# Altium schematic symbol library jlcpcb_2025_04_capacitors_extended_0603.schlib: 3668 symbols (part 12 of 20) (continued)
## CGA3E2X7R2A103KT0Y0N
designator C?  Capacitance: 10nF  (hidden comment: *)
Capacitor, Ceramic (MLCC), 10nF, ±10%, 100V, X7R, ±10%, SMD 0603; Manufacturer: TDK; Manufacturer Part Number: CGA3E2X7R2A103KT0Y0N; Package Size: 0603; JLCPCB Basic Part: No; JLCPCB Part Number: C338047; Supplier 1: LCSC; Category: Capacitors - MLCC; Supplier Part Number 1: C338047; Tolerance: ±10%; Voltage Rating: 100V; Temperature Coefficient: X7R; RoHS: Yes; ComponentLink1Description: Datasheet; ComponentLink1URL: https://wmsc.lcsc.com/wmsc/upload/file/pdf/v2/lcsc/2304140030_TDK-CGA3E2X7R2A103KT0Y0N_C338047.pdf; ComponentLink2Description: JLCPCB Part URL; ComponentLink2URL: https://jlcpcb.com/partdetail/C338047; ComponentLink3Description: LCSC Part URL; ComponentLink3URL: https://lcsc.com/product-detail/Multilayer-Ceramic-Capacitors-MLCC---SMD-SMT_TDK-TDK-CGA3E2X7R2A103KT0Y0N_C338047.html
footprint CAP-0603 (0603 (1608M) Capacitor)
pins: 1, 2

## CGA3E2X7R2A223KT0Y0N
designator C?  Capacitance: 22nF  (hidden comment: *)
Capacitor, Ceramic (MLCC), 22nF, ±10%, 100V, X7R, ±10%, SMD 0603; Manufacturer: TDK; Manufacturer Part Number: CGA3E2X7R2A223KT0Y0N; Package Size: 0603; JLCPCB Basic Part: No; JLCPCB Part Number: C342891; Supplier 1: LCSC; Category: Capacitors - MLCC; Supplier Part Number 1: C342891; Tolerance: ±10%; Voltage Rating: 100V; Temperature Coefficient: X7R; RoHS: Yes; ComponentLink1Description: Datasheet; ComponentLink2Description: JLCPCB Part URL; ComponentLink2URL: https://jlcpcb.com/partdetail/C342891; ComponentLink3Description: LCSC Part URL; ComponentLink3URL: https://lcsc.com/product-detail/Multilayer-Ceramic-Capacitors-MLCC---SMD-SMT_TDK-TDK-CGA3E2X7R2A223KT0Y0N_C342891.html
footprint CAP-0603 (0603 (1608M) Capacitor)
pins: 1, 2

## CGA3E2X7R2A332KT0Y0N
designator C?  Capacitance: 3.3nF  (hidden comment: *)
Capacitor, Ceramic (MLCC), 3.3nF, ±10%, 100V, X7R, ±10%, SMD 0603; Manufacturer: TDK; Manufacturer Part Number: CGA3E2X7R2A332KT0Y0N; Package Size: 0603; JLCPCB Basic Part: No; JLCPCB Part Number: C338064; Supplier 1: LCSC; Category: Capacitors - MLCC; Supplier Part Number 1: C338064; Tolerance: ±10%; Voltage Rating: 100V; Temperature Coefficient: X7R; RoHS: Yes; ComponentLink1Description: Datasheet; ComponentLink1URL: https://wmsc.lcsc.com/wmsc/upload/file/pdf/v2/lcsc/2304140030_TDK-CGA3E2X7R2A332KT0Y0N_C338064.pdf; ComponentLink2Description: JLCPCB Part URL; ComponentLink2URL: https://jlcpcb.com/partdetail/C338064; ComponentLink3Description: LCSC Part URL; ComponentLink3URL: https://lcsc.com/product-detail/Multilayer-Ceramic-Capacitors-MLCC---SMD-SMT_TDK-TDK-CGA3E2X7R2A332KT0Y0N_C338064.html
footprint CAP-0603 (0603 (1608M) Capacitor)
pins: 1, 2

## CGA3E2X7R2A472KT0Y0N
designator C?  Capacitance: 4.7nF  (hidden comment: *)
Capacitor, Ceramic (MLCC), 4.7nF, ±10%, 100V, X7R, ±10%, SMD 0603; Manufacturer: TDK; Manufacturer Part Number: CGA3E2X7R2A472KT0Y0N; Package Size: 0603; JLCPCB Basic Part: No; JLCPCB Part Number: C342899; Supplier 1: LCSC; Category: Capacitors - MLCC; Supplier Part Number 1: C342899; Tolerance: ±10%; Voltage Rating: 100V; Temperature Coefficient: X7R; RoHS: Yes; ComponentLink1Description: Datasheet; ComponentLink1URL: https://wmsc.lcsc.com/wmsc/upload/file/pdf/v2/lcsc/2304140030_TDK-CGA3E2X7R2A472KT0Y0N_C342899.pdf; ComponentLink2Description: JLCPCB Part URL; ComponentLink2URL: https://jlcpcb.com/partdetail/C342899; ComponentLink3Description: LCSC Part URL; ComponentLink3URL: https://lcsc.com/product-detail/Multilayer-Ceramic-Capacitors-MLCC---SMD-SMT_TDK-TDK-CGA3E2X7R2A472KT0Y0N_C342899.html
footprint CAP-0603 (0603 (1608M) Capacitor)
pins: 1, 2

## CGA3E2X8R1H102KT0Y0H
designator C?  Capacitance: 1nF  (hidden comment: *)
Capacitor, Ceramic (MLCC), 1nF, ±10%, 50V, X8R, ±10%, SMD 0603; Manufacturer: TDK; Manufacturer Part Number: CGA3E2X8R1H102KT0Y0H; Package Size: 0603; JLCPCB Basic Part: No; JLCPCB Part Number: C342999; Supplier 1: LCSC; Category: Capacitors - MLCC; Supplier Part Number 1: C342999; Tolerance: ±10%; Voltage Rating: 50V; Temperature Coefficient: X8R; RoHS: Yes; ComponentLink1Description: Datasheet; ComponentLink1URL: https://wmsc.lcsc.com/wmsc/upload/file/pdf/v2/lcsc/2205091745_TDK-CGA3E2X8R1H102KT0Y0H_C342999.pdf; ComponentLink2Description: JLCPCB Part URL; ComponentLink2URL: https://jlcpcb.com/partdetail/C342999; ComponentLink3Description: LCSC Part URL; ComponentLink3URL: https://lcsc.com/product-detail/Multilayer-Ceramic-Capacitors-MLCC---SMD-SMT_TDK-TDK-CGA3E2X8R1H102KT0Y0H_C342999.html
footprint CAP-0603 (0603 (1608M) Capacitor)
pins: 1, 2

## CGA3E2X8R1H103KT0Y0H
designator C?  Capacitance: 10nF  (hidden comment: *)
Capacitor, Ceramic (MLCC), 10nF, ±10%, 50V, X8R, ±10%, SMD 0603; Manufacturer: TDK; Manufacturer Part Number: CGA3E2X8R1H103KT0Y0H; Package Size: 0603; JLCPCB Basic Part: No; JLCPCB Part Number: C445735; Supplier 1: LCSC; Category: Capacitors - MLCC; Supplier Part Number 1: C445735; Tolerance: ±10%; Voltage Rating: 50V; Temperature Coefficient: X8R; RoHS: Yes; ComponentLink1Description: Datasheet; ComponentLink1URL: https://wmsc.lcsc.com/wmsc/upload/file/pdf/v2/lcsc/2304140030_TDK-CGA3E2X8R1H103KT0Y0H_C445735.pdf; ComponentLink2Description: JLCPCB Part URL; ComponentLink2URL: https://jlcpcb.com/partdetail/C445735; ComponentLink3Description: LCSC Part URL; ComponentLink3URL: https://lcsc.com/product-detail/Multilayer-Ceramic-Capacitors-MLCC---SMD-SMT_TDK-TDK-CGA3E2X8R1H103KT0Y0H_C445735.html
footprint CAP-0603 (0603 (1608M) Capacitor)
pins: 1, 2

## CGA3E2X8R1H222KT0Y0H
designator C?  Capacitance: 2.2nF  (hidden comment: *)
Capacitor, Ceramic (MLCC), 2.2nF, ±10%, 50V, X8R, ±10%, SMD 0603; Manufacturer: TDK; Manufacturer Part Number: CGA3E2X8R1H222KT0Y0H; Package Size: 0603; JLCPCB Basic Part: No; JLCPCB Part Number: C343000; Supplier 1: LCSC; Category: Capacitors - MLCC; Supplier Part Number 1: C343000; Tolerance: ±10%; Voltage Rating: 50V; Temperature Coefficient: X8R; RoHS: Yes; ComponentLink1Description: Datasheet; ComponentLink1URL: https://wmsc.lcsc.com/wmsc/upload/file/pdf/v2/lcsc/1912111437_TDK-CGA3E2X8R1H222KT0Y0H_C343000.pdf; ComponentLink2Description: JLCPCB Part URL; ComponentLink2URL: https://jlcpcb.com/partdetail/C343000; ComponentLink3Description: LCSC Part URL; ComponentLink3URL: https://lcsc.com/product-detail/Multilayer-Ceramic-Capacitors-MLCC---SMD-SMT_TDK-TDK-CGA3E2X8R1H222KT0Y0H_C343000.html
footprint CAP-0603 (0603 (1608M) Capacitor)
pins: 1, 2

## CGA3E2X8R1H332KT0Y0H
designator C?  Capacitance: 3.3nF  (hidden comment: *)
Capacitor, Ceramic (MLCC), 3.3nF, ±10%, 50V, X8R, ±10%, SMD 0603; Manufacturer: TDK; Manufacturer Part Number: CGA3E2X8R1H332KT0Y0H; Package Size: 0603; JLCPCB Basic Part: No; JLCPCB Part Number: C432942; Supplier 1: LCSC; Category: Capacitors - MLCC; Supplier Part Number 1: C432942; Tolerance: ±10%; Voltage Rating: 50V; Temperature Coefficient: X8R; RoHS: Yes; ComponentLink1Description: Datasheet; ComponentLink1URL: https://wmsc.lcsc.com/wmsc/upload/file/pdf/v2/lcsc/2304140030_TDK-CGA3E2X8R1H332KT0Y0H_C432942.pdf; ComponentLink2Description: JLCPCB Part URL; ComponentLink2URL: https://jlcpcb.com/partdetail/C432942; ComponentLink3Description: LCSC Part URL; ComponentLink3URL: https://lcsc.com/product-detail/Multilayer-Ceramic-Capacitors-MLCC---SMD-SMT_TDK-TDK-CGA3E2X8R1H332KT0Y0H_C432942.html
footprint CAP-0603 (0603 (1608M) Capacitor)
pins: 1, 2

## CGA3E2X8R1H473KT0Y0H
designator C?  Capacitance: 47nF  (hidden comment: *)
Capacitor, Ceramic (MLCC), 47nF, ±10%, 50V, X8R, ±10%, SMD 0603; Manufacturer: TDK; Manufacturer Part Number: CGA3E2X8R1H473KT0Y0H; Package Size: 0603; JLCPCB Basic Part: No; JLCPCB Part Number: C342975; Supplier 1: LCSC; Category: Capacitors - MLCC; Supplier Part Number 1: C342975; Tolerance: ±10%; Voltage Rating: 50V; Temperature Coefficient: X8R; RoHS: Yes; ComponentLink1Description: Datasheet; ComponentLink1URL: https://wmsc.lcsc.com/wmsc/upload/file/pdf/v2/lcsc/2304140030_TDK-CGA3E2X8R1H473KT0Y0H_C342975.pdf; ComponentLink2Description: JLCPCB Part URL; ComponentLink2URL: https://jlcpcb.com/partdetail/C342975; ComponentLink3Description: LCSC Part URL; ComponentLink3URL: https://lcsc.com/product-detail/Multilayer-Ceramic-Capacitors-MLCC---SMD-SMT_TDK-TDK-CGA3E2X8R1H473KT0Y0H_C342975.html
footprint CAP-0603 (0603 (1608M) Capacitor)
pins: 1, 2

## CGA3E2X8R2A103KT0Y0H
designator C?  Capacitance: 10nF  (hidden comment: *)
Capacitor, Ceramic (MLCC), 10nF, ±10%, 100V, X8R, ±10%, SMD 0603; Manufacturer: TDK; Manufacturer Part Number: CGA3E2X8R2A103KT0Y0H; Package Size: 0603; JLCPCB Basic Part: No; JLCPCB Part Number: C445734; Supplier 1: LCSC; Category: Capacitors - MLCC; Supplier Part Number 1: C445734; Tolerance: ±10%; Voltage Rating: 100V; Temperature Coefficient: X8R; RoHS: Yes; ComponentLink1Description: Datasheet; ComponentLink1URL: https://wmsc.lcsc.com/wmsc/upload/file/pdf/v2/lcsc/2304140030_TDK-CGA3E2X8R2A103KT0Y0H_C445734.pdf; ComponentLink2Description: JLCPCB Part URL; ComponentLink2URL: https://jlcpcb.com/partdetail/C445734; ComponentLink3Description: LCSC Part URL; ComponentLink3URL: https://lcsc.com/product-detail/Multilayer-Ceramic-Capacitors-MLCC---SMD-SMT_TDK-TDK-CGA3E2X8R2A103KT0Y0H_C445734.html
footprint CAP-0603 (0603 (1608M) Capacitor)
pins: 1, 2

## CGA3E2X8R2A222KT0Y0H
designator C?  Capacitance: 2.2nF  (hidden comment: *)
Capacitor, Ceramic (MLCC), 2.2nF, ±10%, 100V, X8R, ±10%, SMD 0603; Manufacturer: TDK; Manufacturer Part Number: CGA3E2X8R2A222KT0Y0H; Package Size: 0603; JLCPCB Basic Part: No; JLCPCB Part Number: C694502; Supplier 1: LCSC; Category: Capacitors - MLCC; Supplier Part Number 1: C694502; Tolerance: ±10%; Voltage Rating: 100V; Temperature Coefficient: X8R; RoHS: Yes; ComponentLink1Description: Datasheet; ComponentLink1URL: https://wmsc.lcsc.com/wmsc/upload/file/pdf/v2/lcsc/2304140030_TDK-CGA3E2X8R2A222KT0Y0H_C694502.pdf; ComponentLink2Description: JLCPCB Part URL; ComponentLink2URL: https://jlcpcb.com/partdetail/C694502; ComponentLink3Description: LCSC Part URL; ComponentLink3URL: https://lcsc.com/product-detail/Multilayer-Ceramic-Capacitors-MLCC---SMD-SMT_TDK-TDK-CGA3E2X8R2A222KT0Y0H_C694502.html
footprint CAP-0603 (0603 (1608M) Capacitor)
pins: 1, 2

## CGA3E2X8R2A472KT0Y0H
designator C?  Capacitance: 4.7nF  (hidden comment: *)
Capacitor, Ceramic (MLCC), 4.7nF, ±10%, 100V, X8R, ±10%, SMD 0603; Manufacturer: TDK; Manufacturer Part Number: CGA3E2X8R2A472KT0Y0H; Package Size: 0603; JLCPCB Basic Part: No; JLCPCB Part Number: C880688; Supplier 1: LCSC; Category: Capacitors - MLCC; Supplier Part Number 1: C880688; Tolerance: ±10%; Voltage Rating: 100V; Temperature Coefficient: X8R; RoHS: Yes; ComponentLink1Description: Datasheet; ComponentLink1URL: https://wmsc.lcsc.com/wmsc/upload/file/pdf/v2/lcsc/2304140030_TDK-CGA3E2X8R2A472KT0Y0H_C880688.pdf; ComponentLink2Description: JLCPCB Part URL; ComponentLink2URL: https://jlcpcb.com/partdetail/C880688; ComponentLink3Description: LCSC Part URL; ComponentLink3URL: https://lcsc.com/product-detail/Multilayer-Ceramic-Capacitors-MLCC---SMD-SMT_TDK-TDK-CGA3E2X8R2A472KT0Y0H_C880688.html
footprint CAP-0603 (0603 (1608M) Capacitor)
pins: 1, 2

## CGA3E3C0G2E101JT0Y0N
designator C?  Capacitance: 100pF  (hidden comment: *)
Capacitor, Ceramic (MLCC), 100pF, ±5%, 250V, C0G, ±5%, SMD 0603; Manufacturer: TDK; Manufacturer Part Number: CGA3E3C0G2E101JT0Y0N; Package Size: 0603; JLCPCB Basic Part: No; JLCPCB Part Number: C342924; Supplier 1: LCSC; Category: Capacitors - MLCC; Supplier Part Number 1: C342924; Tolerance: ±5%; Voltage Rating: 250V; Temperature Coefficient: C0G; RoHS: Yes; ComponentLink1Description: Datasheet; ComponentLink1URL: https://wmsc.lcsc.com/wmsc/upload/file/pdf/v2/lcsc/2304140030_TDK-CGA3E3C0G2E101JT0Y0N_C342924.pdf; ComponentLink2Description: JLCPCB Part URL; ComponentLink2URL: https://jlcpcb.com/partdetail/C342924; ComponentLink3Description: LCSC Part URL; ComponentLink3URL: https://lcsc.com/product-detail/Multilayer-Ceramic-Capacitors-MLCC---SMD-SMT_TDK-TDK-CGA3E3C0G2E101JT0Y0N_C342924.html
footprint CAP-0603 (0603 (1608M) Capacitor)
pins: 1, 2

## CGA3E3C0G2E221JT0Y0N
designator C?  Capacitance: 220pF  (hidden comment: *)
Capacitor, Ceramic (MLCC), 220pF, ±5%, 250V, C0G, ±5%, SMD 0603; Manufacturer: TDK; Manufacturer Part Number: CGA3E3C0G2E221JT0Y0N; Package Size: 0603; JLCPCB Basic Part: No; JLCPCB Part Number: C695386; Supplier 1: LCSC; Category: Capacitors - MLCC; Supplier Part Number 1: C695386; Tolerance: ±5%; Voltage Rating: 250V; Temperature Coefficient: C0G; RoHS: Yes; ComponentLink1Description: Datasheet; ComponentLink1URL: https://wmsc.lcsc.com/wmsc/upload/file/pdf/v2/lcsc/2009151538_TDK-CGA3E3C0G2E221JT0Y0N_C695386.pdf; ComponentLink2Description: JLCPCB Part URL; ComponentLink2URL: https://jlcpcb.com/partdetail/C695386; ComponentLink3Description: LCSC Part URL; ComponentLink3URL: https://lcsc.com/product-detail/Multilayer-Ceramic-Capacitors-MLCC---SMD-SMT_TDK-TDK-CGA3E3C0G2E221JT0Y0N_C695386.html
footprint CAP-0603 (0603 (1608M) Capacitor)
pins: 1, 2

## CGA3E3X5R1H105KT0Y0N
designator C?  Capacitance: 1uF  (hidden comment: *)
Capacitor, Ceramic (MLCC), 1uF, ±10%, 50V, X5R, ±10%, SMD 0603; Manufacturer: TDK; Manufacturer Part Number: CGA3E3X5R1H105KT0Y0N; Package Size: 0603; JLCPCB Basic Part: No; JLCPCB Part Number: C342951; Supplier 1: LCSC; Category: Capacitors - MLCC; Supplier Part Number 1: C342951; Tolerance: ±10%; Voltage Rating: 50V; Temperature Coefficient: X5R; RoHS: Yes; ComponentLink1Description: Datasheet; ComponentLink1URL: https://wmsc.lcsc.com/wmsc/upload/file/pdf/v2/lcsc/2304140030_TDK-CGA3E3X5R1H105KT0Y0N_C342951.pdf; ComponentLink2Description: JLCPCB Part URL; ComponentLink2URL: https://jlcpcb.com/partdetail/C342951; ComponentLink3Description: LCSC Part URL; ComponentLink3URL: https://lcsc.com/product-detail/Multilayer-Ceramic-Capacitors-MLCC---SMD-SMT_TDK-TDK-CGA3E3X5R1H105KT0Y0N_C342951.html
footprint CAP-0603 (0603 (1608M) Capacitor)
pins: 1, 2

## CGA3E3X5R1H474KT0Y0N
designator C?  Capacitance: 470nF  (hidden comment: *)
Capacitor, Ceramic (MLCC), 470nF, ±10%, 50V, X5R, ±10%, SMD 0603; Manufacturer: TDK; Manufacturer Part Number: CGA3E3X5R1H474KT0Y0N; Package Size: 0603; JLCPCB Basic Part: No; JLCPCB Part Number: C694503; Supplier 1: LCSC; Category: Capacitors - MLCC; Supplier Part Number 1: C694503; Tolerance: ±10%; Voltage Rating: 50V; Temperature Coefficient: X5R; RoHS: Yes; ComponentLink1Description: Datasheet; ComponentLink1URL: https://wmsc.lcsc.com/wmsc/upload/file/pdf/v2/lcsc/2304140030_TDK-CGA3E3X5R1H474KT0Y0N_C694503.pdf; ComponentLink2Description: JLCPCB Part URL; ComponentLink2URL: https://jlcpcb.com/partdetail/C694503; ComponentLink3Description: LCSC Part URL; ComponentLink3URL: https://lcsc.com/product-detail/Multilayer-Ceramic-Capacitors-MLCC---SMD-SMT_TDK-TDK-CGA3E3X5R1H474KT0Y0N_C694503.html
footprint CAP-0603 (0603 (1608M) Capacitor)
pins: 1, 2

## CGA3E3X5R1H684K080AB
designator C?  Capacitance: 680nF  (hidden comment: *)
Capacitor, Ceramic (MLCC), 680nF, ±10%, 50V, X5R, ±10%, SMD 0603; Manufacturer: TDK; Manufacturer Part Number: CGA3E3X5R1H684K080AB; Package Size: 0603; JLCPCB Basic Part: No; JLCPCB Part Number: C3841920; Supplier 1: LCSC; Category: Capacitors - MLCC; Supplier Part Number 1: C3841920; Tolerance: ±10%; Voltage Rating: 50V; Temperature Coefficient: X5R; RoHS: Yes; ComponentLink1Description: Datasheet; ComponentLink1URL: https://wmsc.lcsc.com/wmsc/upload/file/pdf/v2/lcsc/2401221252_TDK-CGA3E3X5R1H684K080AB_C3841920.pdf; ComponentLink2Description: JLCPCB Part URL; ComponentLink2URL: https://jlcpcb.com/partdetail/C3841920; ComponentLink3Description: LCSC Part URL; ComponentLink3URL: https://lcsc.com/product-detail/Multilayer-Ceramic-Capacitors-MLCC---SMD-SMT_TDK-TDK-CGA3E3X5R1H684K080AB_C3841920.html
footprint CAP-0603 (0603 (1608M) Capacitor)
pins: 1, 2

## CGA3E3X5R1H684KT0Y0N
designator C?  Capacitance: 680nF  (hidden comment: *)
Capacitor, Ceramic (MLCC), 680nF, ±10%, 50V, X5R, ±10%, SMD 0603; Manufacturer: TDK; Manufacturer Part Number: CGA3E3X5R1H684KT0Y0N; Package Size: 0603; JLCPCB Basic Part: No; JLCPCB Part Number: C694504; Supplier 1: LCSC; Category: Capacitors - MLCC; Supplier Part Number 1: C694504; Tolerance: ±10%; Voltage Rating: 50V; Temperature Coefficient: X5R; RoHS: Yes; ComponentLink1Description: Datasheet; ComponentLink1URL: https://wmsc.lcsc.com/wmsc/upload/file/pdf/v2/lcsc/2304140030_TDK-CGA3E3X5R1H684KT0Y0N_C694504.pdf; ComponentLink2Description: JLCPCB Part URL; ComponentLink2URL: https://jlcpcb.com/partdetail/C694504; ComponentLink3Description: LCSC Part URL; ComponentLink3URL: https://lcsc.com/product-detail/Multilayer-Ceramic-Capacitors-MLCC---SMD-SMT_TDK-TDK-CGA3E3X5R1H684KT0Y0N_C694504.html
footprint CAP-0603 (0603 (1608M) Capacitor)
pins: 1, 2

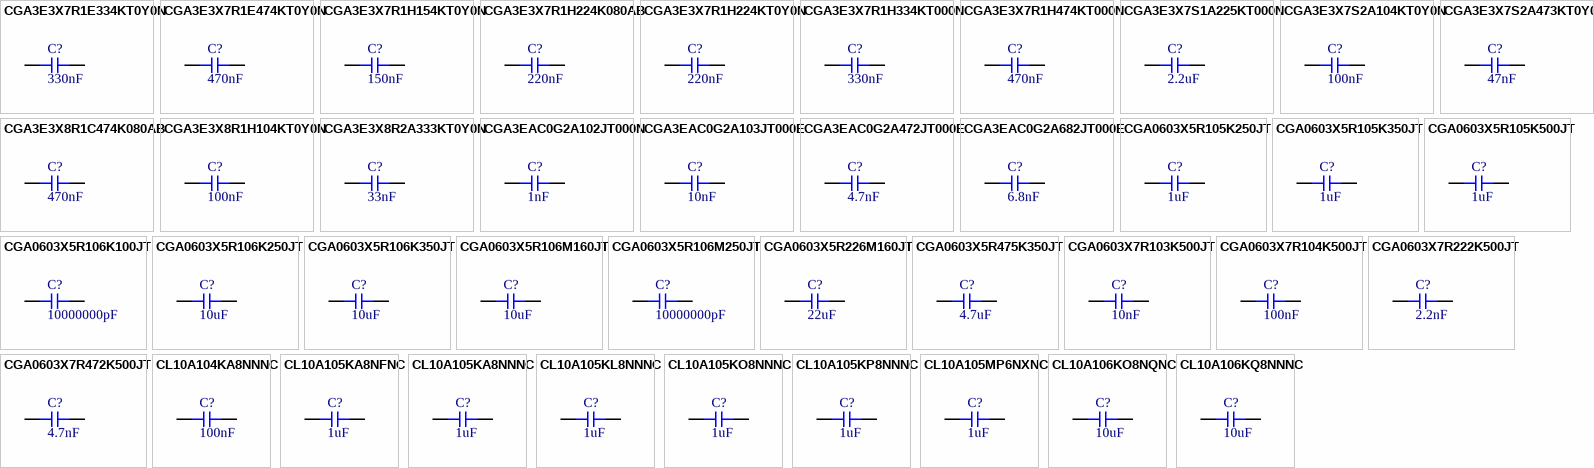
[diagram p54: symbols CGA3E3X7R1E334KT0Y0N to CL10A106KQ8NNNC]

## CGA3E3X7R1E334KT0Y0N
designator C?  Capacitance: 330nF  (hidden comment: *)
Capacitor, Ceramic (MLCC), 330nF, ±10%, 25V, X7R, ±10%, SMD 0603; Manufacturer: TDK; Manufacturer Part Number: CGA3E3X7R1E334KT0Y0N; Package Size: 0603; JLCPCB Basic Part: No; JLCPCB Part Number: C445737; Supplier 1: LCSC; Category: Capacitors - MLCC; Supplier Part Number 1: C445737; Tolerance: ±10%; Voltage Rating: 25V; Temperature Coefficient: X7R; RoHS: Yes; ComponentLink1Description: Datasheet; ComponentLink1URL: https://wmsc.lcsc.com/wmsc/upload/file/pdf/v2/lcsc/2304140030_TDK-CGA3E3X7R1E334KT0Y0N_C445737.pdf; ComponentLink2Description: JLCPCB Part URL; ComponentLink2URL: https://jlcpcb.com/partdetail/C445737; ComponentLink3Description: LCSC Part URL; ComponentLink3URL: https://lcsc.com/product-detail/Multilayer-Ceramic-Capacitors-MLCC---SMD-SMT_TDK-TDK-CGA3E3X7R1E334KT0Y0N_C445737.html
footprint CAP-0603 (0603 (1608M) Capacitor)
pins: 1, 2

## CGA3E3X7R1E474KT0Y0N
designator C?  Capacitance: 470nF  (hidden comment: *)
Capacitor, Ceramic (MLCC), 470nF, ±10%, 25V, X7R, ±10%, SMD 0603; Manufacturer: TDK; Manufacturer Part Number: CGA3E3X7R1E474KT0Y0N; Package Size: 0603; JLCPCB Basic Part: No; JLCPCB Part Number: C342987; Supplier 1: LCSC; Category: Capacitors - MLCC; Supplier Part Number 1: C342987; Tolerance: ±10%; Voltage Rating: 25V; Temperature Coefficient: X7R; RoHS: Yes; ComponentLink1Description: Datasheet; ComponentLink1URL: https://wmsc.lcsc.com/wmsc/upload/file/pdf/v2/lcsc/1912111437_TDK-CGA3E3X7R1E474KT0Y0N_C342987.pdf; ComponentLink2Description: JLCPCB Part URL; ComponentLink2URL: https://jlcpcb.com/partdetail/C342987; ComponentLink3Description: LCSC Part URL; ComponentLink3URL: https://lcsc.com/product-detail/Multilayer-Ceramic-Capacitors-MLCC---SMD-SMT_TDK-TDK-CGA3E3X7R1E474KT0Y0N_C342987.html
footprint CAP-0603 (0603 (1608M) Capacitor)
pins: 1, 2

## CGA3E3X7R1H154KT0Y0N
designator C?  Capacitance: 150nF  (hidden comment: *)
Capacitor, Ceramic (MLCC), 150nF, ±10%, 50V, X7R, ±10%, SMD 0603; Manufacturer: TDK; Manufacturer Part Number: CGA3E3X7R1H154KT0Y0N; Package Size: 0603; JLCPCB Basic Part: No; JLCPCB Part Number: C432943; Supplier 1: LCSC; Category: Capacitors - MLCC; Supplier Part Number 1: C432943; Tolerance: ±10%; Voltage Rating: 50V; Temperature Coefficient: X7R; RoHS: Yes; ComponentLink1Description: Datasheet; ComponentLink1URL: https://wmsc.lcsc.com/wmsc/upload/file/pdf/v2/lcsc/2304140030_TDK-CGA3E3X7R1H154KT0Y0N_C432943.pdf; ComponentLink2Description: JLCPCB Part URL; ComponentLink2URL: https://jlcpcb.com/partdetail/C432943; ComponentLink3Description: LCSC Part URL; ComponentLink3URL: https://lcsc.com/product-detail/Multilayer-Ceramic-Capacitors-MLCC---SMD-SMT_TDK-TDK-CGA3E3X7R1H154KT0Y0N_C432943.html
footprint CAP-0603 (0603 (1608M) Capacitor)
pins: 1, 2

## CGA3E3X7R1H224K080AB
designator C?  Capacitance: 220nF  (hidden comment: *)
Capacitor, Ceramic (MLCC), 220nF, ±10%, 50V, X7R, ±10%, SMD 0603; Manufacturer: TDK; Manufacturer Part Number: CGA3E3X7R1H224K080AB; Package Size: 0603; JLCPCB Basic Part: No; JLCPCB Part Number: C2167174; Supplier 1: LCSC; Category: Capacitors - MLCC; Supplier Part Number 1: C2167174; Tolerance: ±10%; Voltage Rating: 50V; Temperature Coefficient: X7R; RoHS: Yes; ComponentLink1Description: Datasheet; ComponentLink1URL: https://wmsc.lcsc.com/wmsc/upload/file/pdf/v2/lcsc/2304140030_TDK-CGA3E3X7R1H224K080AB_C2167174.pdf; ComponentLink2Description: JLCPCB Part URL; ComponentLink2URL: https://jlcpcb.com/partdetail/C2167174; ComponentLink3Description: LCSC Part URL; ComponentLink3URL: https://lcsc.com/product-detail/Multilayer-Ceramic-Capacitors-MLCC---SMD-SMT_TDK-TDK-CGA3E3X7R1H224K080AB_C2167174.html
footprint CAP-0603 (0603 (1608M) Capacitor)
pins: 1, 2

## CGA3E3X7R1H224KT0Y0N
designator C?  Capacitance: 220nF  (hidden comment: *)
Capacitor, Ceramic (MLCC), 220nF, ±10%, 50V, X7R, ±10%, SMD 0603; Manufacturer: TDK; Manufacturer Part Number: CGA3E3X7R1H224KT0Y0N; Package Size: 0603; JLCPCB Basic Part: No; JLCPCB Part Number: C342967; Supplier 1: LCSC; Category: Capacitors - MLCC; Supplier Part Number 1: C342967; Tolerance: ±10%; Voltage Rating: 50V; Temperature Coefficient: X7R; RoHS: Yes; ComponentLink1Description: Datasheet; ComponentLink1URL: https://wmsc.lcsc.com/wmsc/upload/file/pdf/v2/lcsc/2304140030_TDK-CGA3E3X7R1H224KT0Y0N_C342967.pdf; ComponentLink2Description: JLCPCB Part URL; ComponentLink2URL: https://jlcpcb.com/partdetail/C342967; ComponentLink3Description: LCSC Part URL; ComponentLink3URL: https://lcsc.com/product-detail/Multilayer-Ceramic-Capacitors-MLCC---SMD-SMT_TDK-TDK-CGA3E3X7R1H224KT0Y0N_C342967.html
footprint CAP-0603 (0603 (1608M) Capacitor)
pins: 1, 2

## CGA3E3X7R1H334KT000N
designator C?  Capacitance: 330nF  (hidden comment: *)
Capacitor, Ceramic (MLCC), 330nF, ±10%, 50V, X7R, ±10%, SMD 0603; Manufacturer: TDK; Manufacturer Part Number: CGA3E3X7R1H334KT000N; Package Size: 0603; JLCPCB Basic Part: No; JLCPCB Part Number: C342856; Supplier 1: LCSC; Category: Capacitors - MLCC; Supplier Part Number 1: C342856; Tolerance: ±10%; Voltage Rating: 50V; Temperature Coefficient: X7R; RoHS: Yes; ComponentLink1Description: Datasheet; ComponentLink1URL: https://wmsc.lcsc.com/wmsc/upload/file/pdf/v2/lcsc/2304140030_TDK-CGA3E3X7R1H334KT000N_C342856.pdf; ComponentLink2Description: JLCPCB Part URL; ComponentLink2URL: https://jlcpcb.com/partdetail/C342856; ComponentLink3Description: LCSC Part URL; ComponentLink3URL: https://lcsc.com/product-detail/Multilayer-Ceramic-Capacitors-MLCC---SMD-SMT_TDK-TDK-CGA3E3X7R1H334KT000N_C342856.html
footprint CAP-0603 (0603 (1608M) Capacitor)
pins: 1, 2

## CGA3E3X7R1H474KT000N
designator C?  Capacitance: 470nF  (hidden comment: *)
Capacitor, Ceramic (MLCC), 470nF, ±10%, 50V, X7R, ±10%, SMD 0603; Manufacturer: TDK; Manufacturer Part Number: CGA3E3X7R1H474KT000N; Package Size: 0603; JLCPCB Basic Part: No; JLCPCB Part Number: C342857; Supplier 1: LCSC; Category: Capacitors - MLCC; Supplier Part Number 1: C342857; Tolerance: ±10%; Voltage Rating: 50V; Temperature Coefficient: X7R; RoHS: Yes; ComponentLink1Description: Datasheet; ComponentLink1URL: https://wmsc.lcsc.com/wmsc/upload/file/pdf/v2/lcsc/2304140030_TDK-CGA3E3X7R1H474KT000N_C342857.pdf; ComponentLink2Description: JLCPCB Part URL; ComponentLink2URL: https://jlcpcb.com/partdetail/C342857; ComponentLink3Description: LCSC Part URL; ComponentLink3URL: https://lcsc.com/product-detail/Multilayer-Ceramic-Capacitors-MLCC---SMD-SMT_TDK-TDK-CGA3E3X7R1H474KT000N_C342857.html
footprint CAP-0603 (0603 (1608M) Capacitor)
pins: 1, 2

## CGA3E3X7S1A225KT000N
designator C?  Capacitance: 2.2uF  (hidden comment: *)
Capacitor, Ceramic (MLCC), 2.2uF, ±10%, 10V, X7S, ±10%, SMD 0603; Manufacturer: TDK; Manufacturer Part Number: CGA3E3X7S1A225KT000N; Package Size: 0603; JLCPCB Basic Part: No; JLCPCB Part Number: C338105; Supplier 1: LCSC; Category: Capacitors - MLCC; Supplier Part Number 1: C338105; Tolerance: ±10%; Voltage Rating: 10V; Temperature Coefficient: X7S; RoHS: Yes; ComponentLink1Description: Datasheet; ComponentLink1URL: https://wmsc.lcsc.com/wmsc/upload/file/pdf/v2/lcsc/2304140030_TDK-CGA3E3X7S1A225KT000N_C338105.pdf; ComponentLink2Description: JLCPCB Part URL; ComponentLink2URL: https://jlcpcb.com/partdetail/C338105; ComponentLink3Description: LCSC Part URL; ComponentLink3URL: https://lcsc.com/product-detail/Multilayer-Ceramic-Capacitors-MLCC---SMD-SMT_TDK-TDK-CGA3E3X7S1A225KT000N_C338105.html
footprint CAP-0603 (0603 (1608M) Capacitor)
pins: 1, 2

## CGA3E3X7S2A104KT0Y0N
designator C?  Capacitance: 100nF  (hidden comment: *)
Capacitor, Ceramic (MLCC), 100nF, ±10%, 100V, X7S, ±10%, SMD 0603; Manufacturer: TDK; Manufacturer Part Number: CGA3E3X7S2A104KT0Y0N; Package Size: 0603; JLCPCB Basic Part: No; JLCPCB Part Number: C338075; Supplier 1: LCSC; Category: Capacitors - MLCC; Supplier Part Number 1: C338075; Tolerance: ±10%; Voltage Rating: 100V; Temperature Coefficient: X7S; RoHS: Yes; ComponentLink1Description: Datasheet; ComponentLink1URL: https://wmsc.lcsc.com/wmsc/upload/file/pdf/v2/lcsc/2304140030_TDK-CGA3E3X7S2A104KT0Y0N_C338075.pdf; ComponentLink2Description: JLCPCB Part URL; ComponentLink2URL: https://jlcpcb.com/partdetail/C338075; ComponentLink3Description: LCSC Part URL; ComponentLink3URL: https://lcsc.com/product-detail/Multilayer-Ceramic-Capacitors-MLCC---SMD-SMT_TDK-TDK-CGA3E3X7S2A104KT0Y0N_C338075.html
footprint CAP-0603 (0603 (1608M) Capacitor)
pins: 1, 2

## CGA3E3X7S2A473KT0Y0N
designator C?  Capacitance: 47nF  (hidden comment: *)
Capacitor, Ceramic (MLCC), 47nF, ±10%, 100V, X7S, ±10%, SMD 0603; Manufacturer: TDK; Manufacturer Part Number: CGA3E3X7S2A473KT0Y0N; Package Size: 0603; JLCPCB Basic Part: No; JLCPCB Part Number: C338098; Supplier 1: LCSC; Category: Capacitors - MLCC; Supplier Part Number 1: C338098; Tolerance: ±10%; Voltage Rating: 100V; Temperature Coefficient: X7S; RoHS: Yes; ComponentLink1Description: Datasheet; ComponentLink1URL: https://wmsc.lcsc.com/wmsc/upload/file/pdf/v2/lcsc/2304140030_TDK-CGA3E3X7S2A473KT0Y0N_C338098.pdf; ComponentLink2Description: JLCPCB Part URL; ComponentLink2URL: https://jlcpcb.com/partdetail/C338098; ComponentLink3Description: LCSC Part URL; ComponentLink3URL: https://lcsc.com/product-detail/Multilayer-Ceramic-Capacitors-MLCC---SMD-SMT_TDK-TDK-CGA3E3X7S2A473KT0Y0N_C338098.html
footprint CAP-0603 (0603 (1608M) Capacitor)
pins: 1, 2

## CGA3E3X8R1C474K080AB
designator C?  Capacitance: 470nF  (hidden comment: *)
Capacitor, Ceramic (MLCC), 470nF, ±10%, 16V, X8R, ±10%, SMD 0603; Manufacturer: TDK; Manufacturer Part Number: CGA3E3X8R1C474K080AB; Package Size: 0603; JLCPCB Basic Part: No; JLCPCB Part Number: C2170045; Supplier 1: LCSC; Category: Capacitors - MLCC; Supplier Part Number 1: C2170045; Tolerance: ±10%; Voltage Rating: 16V; Temperature Coefficient: X8R; RoHS: Yes; ComponentLink1Description: Datasheet; ComponentLink1URL: https://wmsc.lcsc.com/wmsc/upload/file/pdf/v2/lcsc/2304140030_TDK-CGA3E3X8R1C474K080AB_C2170045.pdf; ComponentLink2Description: JLCPCB Part URL; ComponentLink2URL: https://jlcpcb.com/partdetail/C2170045; ComponentLink3Description: LCSC Part URL; ComponentLink3URL: https://lcsc.com/product-detail/Multilayer-Ceramic-Capacitors-MLCC---SMD-SMT_TDK-TDK-CGA3E3X8R1C474K080AB_C2170045.html
footprint CAP-0603 (0603 (1608M) Capacitor)
pins: 1, 2

## CGA3E3X8R1H104KT0Y0N
designator C?  Capacitance: 100nF  (hidden comment: *)
Capacitor, Ceramic (MLCC), 100nF, ±10%, 50V, X8R, ±10%, SMD 0603; Manufacturer: TDK; Manufacturer Part Number: CGA3E3X8R1H104KT0Y0N; Package Size: 0603; JLCPCB Basic Part: No; JLCPCB Part Number: C342825; Supplier 1: LCSC; Category: Capacitors - MLCC; Supplier Part Number 1: C342825; Tolerance: ±10%; Voltage Rating: 50V; Temperature Coefficient: X8R; RoHS: Yes; ComponentLink1Description: Datasheet; ComponentLink1URL: https://wmsc.lcsc.com/wmsc/upload/file/pdf/v2/lcsc/2304140030_TDK-CGA3E3X8R1H104KT0Y0N_C342825.pdf; ComponentLink2Description: JLCPCB Part URL; ComponentLink2URL: https://jlcpcb.com/partdetail/C342825; ComponentLink3Description: LCSC Part URL; ComponentLink3URL: https://lcsc.com/product-detail/Multilayer-Ceramic-Capacitors-MLCC---SMD-SMT_TDK-TDK-CGA3E3X8R1H104KT0Y0N_C342825.html
footprint CAP-0603 (0603 (1608M) Capacitor)
pins: 1, 2

## CGA3E3X8R2A333KT0Y0N
designator C?  Capacitance: 33nF  (hidden comment: *)
Capacitor, Ceramic (MLCC), 33nF, ±10%, 100V, X8R, ±10%, SMD 0603; Manufacturer: TDK; Manufacturer Part Number: CGA3E3X8R2A333KT0Y0N; Package Size: 0603; JLCPCB Basic Part: No; JLCPCB Part Number: C880702; Supplier 1: LCSC; Category: Capacitors - MLCC; Supplier Part Number 1: C880702; Tolerance: ±10%; Voltage Rating: 100V; Temperature Coefficient: X8R; RoHS: Yes; ComponentLink1Description: Datasheet; ComponentLink1URL: https://wmsc.lcsc.com/wmsc/upload/file/pdf/v2/lcsc/2304140030_TDK-CGA3E3X8R2A333KT0Y0N_C880702.pdf; ComponentLink2Description: JLCPCB Part URL; ComponentLink2URL: https://jlcpcb.com/partdetail/C880702; ComponentLink3Description: LCSC Part URL; ComponentLink3URL: https://lcsc.com/product-detail/Multilayer-Ceramic-Capacitors-MLCC---SMD-SMT_TDK-TDK-CGA3E3X8R2A333KT0Y0N_C880702.html
footprint CAP-0603 (0603 (1608M) Capacitor)
pins: 1, 2

## CGA3EAC0G2A102JT000N
designator C?  Capacitance: 1nF  (hidden comment: *)
Capacitor, Ceramic (MLCC), 1nF, ±5%, 100V, C0G, ±5%, SMD 0603; Manufacturer: TDK; Manufacturer Part Number: CGA3EAC0G2A102JT000N; Package Size: 0603; JLCPCB Basic Part: No; JLCPCB Part Number: C361191; Supplier 1: LCSC; Category: Capacitors - MLCC; Supplier Part Number 1: C361191; Tolerance: ±5%; Voltage Rating: 100V; Temperature Coefficient: C0G; RoHS: Yes; ComponentLink1Description: Datasheet; ComponentLink1URL: https://wmsc.lcsc.com/wmsc/upload/file/pdf/v2/lcsc/1912111437_TDK-CGA3EAC0G2A102JT000N_C361191.pdf; ComponentLink2Description: JLCPCB Part URL; ComponentLink2URL: https://jlcpcb.com/partdetail/C361191; ComponentLink3Description: LCSC Part URL; ComponentLink3URL: https://lcsc.com/product-detail/Multilayer-Ceramic-Capacitors-MLCC---SMD-SMT_TDK-TDK-CGA3EAC0G2A102JT000N_C361191.html
footprint CAP-0603 (0603 (1608M) Capacitor)
pins: 1, 2

## CGA3EAC0G2A103JT000E
designator C?  Capacitance: 10nF  (hidden comment: *)
Capacitor, Ceramic (MLCC), 10nF, ±5%, 100V, C0G, ±5%, SMD 0603; Manufacturer: TDK; Manufacturer Part Number: CGA3EAC0G2A103JT000E; Package Size: 0603; JLCPCB Basic Part: No; JLCPCB Part Number: C342796; Supplier 1: LCSC; Category: Capacitors - MLCC; Supplier Part Number 1: C342796; Tolerance: ±5%; Voltage Rating: 100V; Temperature Coefficient: C0G; RoHS: Yes; ComponentLink1Description: Datasheet; ComponentLink1URL: https://wmsc.lcsc.com/wmsc/upload/file/pdf/v2/lcsc/2304140030_TDK-CGA3EAC0G2A103JT000E_C342796.pdf; ComponentLink2Description: JLCPCB Part URL; ComponentLink2URL: https://jlcpcb.com/partdetail/C342796; ComponentLink3Description: LCSC Part URL; ComponentLink3URL: https://lcsc.com/product-detail/Multilayer-Ceramic-Capacitors-MLCC---SMD-SMT_TDK-TDK-CGA3EAC0G2A103JT000E_C342796.html
footprint CAP-0603 (0603 (1608M) Capacitor)
pins: 1, 2

## CGA3EAC0G2A472JT000E
designator C?  Capacitance: 4.7nF  (hidden comment: *)
Capacitor, Ceramic (MLCC), 4.7nF, ±5%, 100V, C0G, ±5%, SMD 0603; Manufacturer: TDK; Manufacturer Part Number: CGA3EAC0G2A472JT000E; Package Size: 0603; JLCPCB Basic Part: No; JLCPCB Part Number: C695387; Supplier 1: LCSC; Category: Capacitors - MLCC; Supplier Part Number 1: C695387; Tolerance: ±5%; Voltage Rating: 100V; Temperature Coefficient: C0G; RoHS: Yes; ComponentLink1Description: Datasheet; ComponentLink1URL: https://wmsc.lcsc.com/wmsc/upload/file/pdf/v2/lcsc/2010141133_TDK-CGA3EAC0G2A472JT000E_C695387.pdf; ComponentLink2Description: JLCPCB Part URL; ComponentLink2URL: https://jlcpcb.com/partdetail/C695387; ComponentLink3Description: LCSC Part URL; ComponentLink3URL: https://lcsc.com/product-detail/Multilayer-Ceramic-Capacitors-MLCC---SMD-SMT_TDK-TDK-CGA3EAC0G2A472JT000E_C695387.html
footprint CAP-0603 (0603 (1608M) Capacitor)
pins: 1, 2

## CGA3EAC0G2A682JT000E
designator C?  Capacitance: 6.8nF  (hidden comment: *)
Capacitor, Ceramic (MLCC), 6.8nF, ±5%, 100V, C0G, ±5%, SMD 0603; Manufacturer: TDK; Manufacturer Part Number: CGA3EAC0G2A682JT000E; Package Size: 0603; JLCPCB Basic Part: No; JLCPCB Part Number: C432944; Supplier 1: LCSC; Category: Capacitors - MLCC; Supplier Part Number 1: C432944; Tolerance: ±5%; Voltage Rating: 100V; Temperature Coefficient: C0G; RoHS: Yes; ComponentLink1Description: Datasheet; ComponentLink1URL: https://wmsc.lcsc.com/wmsc/upload/file/pdf/v2/lcsc/2304140030_TDK-CGA3EAC0G2A682JT000E_C432944.pdf; ComponentLink2Description: JLCPCB Part URL; ComponentLink2URL: https://jlcpcb.com/partdetail/C432944; ComponentLink3Description: LCSC Part URL; ComponentLink3URL: https://lcsc.com/product-detail/Multilayer-Ceramic-Capacitors-MLCC---SMD-SMT_TDK-TDK-CGA3EAC0G2A682JT000E_C432944.html
footprint CAP-0603 (0603 (1608M) Capacitor)
pins: 1, 2

## CGA0603X5R105K250JT
designator C?  Capacitance: 1uF  (hidden comment: *)
Capacitor, Ceramic (MLCC), 1uF, ±10%, 25V, X5R, ±10%, SMD 0603; Manufacturer: HRE; Manufacturer Part Number: CGA0603X5R105K250JT; Package Size: 0603; JLCPCB Basic Part: No; JLCPCB Part Number: C6119818; Supplier 1: LCSC; Category: Capacitors - MLCC; Supplier Part Number 1: C6119818; Tolerance: ±10%; Voltage Rating: 25V; Temperature Coefficient: X5R; RoHS: Yes; ComponentLink1Description: Datasheet; ComponentLink2Description: JLCPCB Part URL; ComponentLink2URL: https://jlcpcb.com/partdetail/C6119818; ComponentLink3Description: LCSC Part URL; ComponentLink3URL: https://lcsc.com/product-detail/Multilayer-Ceramic-Capacitors-MLCC---SMD-SMT_HRE-HRE-CGA0603X5R105K250JT_C6119818.html
footprint CAP-0603 (0603 (1608M) Capacitor)
pins: 1, 2

## CGA0603X5R105K350JT
designator C?  Capacitance: 1uF  (hidden comment: *)
Capacitor, Ceramic (MLCC), 1uF, ±10%, 35V, X5R, ±10%, SMD 0603; Manufacturer: HRE; Manufacturer Part Number: CGA0603X5R105K350JT; Package Size: 0603; JLCPCB Basic Part: No; JLCPCB Part Number: C6119865; Supplier 1: LCSC; Category: Capacitors - MLCC; Supplier Part Number 1: C6119865; Tolerance: ±10%; Voltage Rating: 35V; Temperature Coefficient: X5R; RoHS: Yes; ComponentLink1Description: Datasheet; ComponentLink2Description: JLCPCB Part URL; ComponentLink2URL: https://jlcpcb.com/partdetail/C6119865; ComponentLink3Description: LCSC Part URL; ComponentLink3URL: https://lcsc.com/product-detail/Multilayer-Ceramic-Capacitors-MLCC---SMD-SMT_HRE-HRE-CGA0603X5R105K350JT_C6119865.html
footprint CAP-0603 (0603 (1608M) Capacitor)
pins: 1, 2

## CGA0603X5R105K500JT
designator C?  Capacitance: 1uF  (hidden comment: *)
Capacitor, Ceramic (MLCC), 1uF, ±10%, 50V, X5R, ±10%, SMD 0603; Manufacturer: HRE; Manufacturer Part Number: CGA0603X5R105K500JT; Package Size: 0603; JLCPCB Basic Part: No; JLCPCB Part Number: C6119852; Supplier 1: LCSC; Category: Capacitors - MLCC; Supplier Part Number 1: C6119852; Tolerance: ±10%; Voltage Rating: 50V; Temperature Coefficient: X5R; RoHS: Yes; ComponentLink1Description: Datasheet; ComponentLink2Description: JLCPCB Part URL; ComponentLink2URL: https://jlcpcb.com/partdetail/C6119852; ComponentLink3Description: LCSC Part URL; ComponentLink3URL: https://lcsc.com/product-detail/Multilayer-Ceramic-Capacitors-MLCC---SMD-SMT_HRE-HRE-CGA0603X5R105K500JT_C6119852.html
footprint CAP-0603 (0603 (1608M) Capacitor)
pins: 1, 2

## CGA0603X5R106K100JT
designator C?  Capacitance: 10000000pF  (hidden comment: *)
Capacitor, Ceramic (MLCC), 10000000pF, ±10%, 10V, X5R, ±10%, SMD 0603; Manufacturer: HRE; Manufacturer Part Number: CGA0603X5R106K100JT; Package Size: 0603; JLCPCB Basic Part: No; JLCPCB Part Number: C6119842; Supplier 1: LCSC; Category: Capacitors - MLCC; Supplier Part Number 1: C6119842; Tolerance: ±10%; Voltage Rating: 10V; Temperature Coefficient: X5R; RoHS: Yes; ComponentLink1Description: Datasheet; ComponentLink2Description: JLCPCB Part URL; ComponentLink2URL: https://jlcpcb.com/partdetail/C6119842; ComponentLink3Description: LCSC Part URL; ComponentLink3URL: https://lcsc.com/product-detail/Multilayer-Ceramic-Capacitors-MLCC---SMD-SMT_HRE-HRE-CGA0603X5R106K100JT_C6119842.html
footprint CAP-0603 (0603 (1608M) Capacitor)
pins: 1, 2

## CGA0603X5R106K250JT
designator C?  Capacitance: 10uF  (hidden comment: *)
Capacitor, Ceramic (MLCC), 10uF, ±10%, 25V, X5R, ±10%, SMD 0603; Manufacturer: HRE; Manufacturer Part Number: CGA0603X5R106K250JT; Package Size: 0603; JLCPCB Basic Part: No; JLCPCB Part Number: C6119815; Supplier 1: LCSC; Category: Capacitors - MLCC; Supplier Part Number 1: C6119815; Tolerance: ±10%; Voltage Rating: 25V; Temperature Coefficient: X5R; RoHS: Yes; ComponentLink1Description: Datasheet; ComponentLink2Description: JLCPCB Part URL; ComponentLink2URL: https://jlcpcb.com/partdetail/C6119815; ComponentLink3Description: LCSC Part URL; ComponentLink3URL: https://lcsc.com/product-detail/Multilayer-Ceramic-Capacitors-MLCC---SMD-SMT_HRE-HRE-CGA0603X5R106K250JT_C6119815.html
footprint CAP-0603 (0603 (1608M) Capacitor)
pins: 1, 2

## CGA0603X5R106K350JT
designator C?  Capacitance: 10uF  (hidden comment: *)
Capacitor, Ceramic (MLCC), 10uF, ±10%, 35V, X5R, ±10%, SMD 0603; Manufacturer: HRE; Manufacturer Part Number: CGA0603X5R106K350JT; Package Size: 0603; JLCPCB Basic Part: No; JLCPCB Part Number: C6119879; Supplier 1: LCSC; Category: Capacitors - MLCC; Supplier Part Number 1: C6119879; Tolerance: ±10%; Voltage Rating: 35V; Temperature Coefficient: X5R; RoHS: Yes; ComponentLink1Description: Datasheet; ComponentLink2Description: JLCPCB Part URL; ComponentLink2URL: https://jlcpcb.com/partdetail/C6119879; ComponentLink3Description: LCSC Part URL; ComponentLink3URL: https://lcsc.com/product-detail/Multilayer-Ceramic-Capacitors-MLCC---SMD-SMT_HRE-HRE-CGA0603X5R106K350JT_C6119879.html
footprint CAP-0603 (0603 (1608M) Capacitor)
pins: 1, 2

## CGA0603X5R106M160JT
designator C?  Capacitance: 10uF  (hidden comment: *)
Capacitor, Ceramic (MLCC), 10uF, ±20%, 16V, X5R, ±20%, SMD 0603; Manufacturer: HRE; Manufacturer Part Number: CGA0603X5R106M160JT; Package Size: 0603; JLCPCB Basic Part: No; JLCPCB Part Number: C6119814; Supplier 1: LCSC; Category: Capacitors - MLCC; Supplier Part Number 1: C6119814; Tolerance: ±20%; Voltage Rating: 16V; Temperature Coefficient: X5R; RoHS: Yes; ComponentLink1Description: Datasheet; ComponentLink2Description: JLCPCB Part URL; ComponentLink2URL: https://jlcpcb.com/partdetail/C6119814; ComponentLink3Description: LCSC Part URL; ComponentLink3URL: https://lcsc.com/product-detail/Multilayer-Ceramic-Capacitors-MLCC---SMD-SMT_HRE-HRE-CGA0603X5R106M160JT_C6119814.html
footprint CAP-0603 (0603 (1608M) Capacitor)
pins: 1, 2

## CGA0603X5R106M250JT
designator C?  Capacitance: 10000000pF  (hidden comment: *)
Capacitor, Ceramic (MLCC), 10000000pF, ±20%, 25V, X5R, ±20%, SMD 0603; Manufacturer: HRE; Manufacturer Part Number: CGA0603X5R106M250JT; Package Size: 0603; JLCPCB Basic Part: No; JLCPCB Part Number: C6119874; Supplier 1: LCSC; Category: Capacitors - MLCC; Supplier Part Number 1: C6119874; Tolerance: ±20%; Voltage Rating: 25V; Temperature Coefficient: X5R; RoHS: Yes; ComponentLink1Description: Datasheet; ComponentLink2Description: JLCPCB Part URL; ComponentLink2URL: https://jlcpcb.com/partdetail/C6119874; ComponentLink3Description: LCSC Part URL; ComponentLink3URL: https://lcsc.com/product-detail/Multilayer-Ceramic-Capacitors-MLCC---SMD-SMT_HRE-HRE-CGA0603X5R106M250JT_C6119874.html
footprint CAP-0603 (0603 (1608M) Capacitor)
pins: 1, 2

## CGA0603X5R226M160JT
designator C?  Capacitance: 22uF  (hidden comment: *)
Capacitor, Ceramic (MLCC), 22uF, ±20%, 16V, X5R, ±20%, SMD 0603; Manufacturer: HRE; Manufacturer Part Number: CGA0603X5R226M160JT; Package Size: 0603; JLCPCB Basic Part: No; JLCPCB Part Number: C6119868; Supplier 1: LCSC; Category: Capacitors - MLCC; Supplier Part Number 1: C6119868; Tolerance: ±20%; Voltage Rating: 16V; Temperature Coefficient: X5R; RoHS: Yes; ComponentLink1Description: Datasheet; ComponentLink2Description: JLCPCB Part URL; ComponentLink2URL: https://jlcpcb.com/partdetail/C6119868; ComponentLink3Description: LCSC Part URL; ComponentLink3URL: https://lcsc.com/product-detail/Multilayer-Ceramic-Capacitors-MLCC---SMD-SMT_HRE-HRE-CGA0603X5R226M160JT_C6119868.html
footprint CAP-0603 (0603 (1608M) Capacitor)
pins: 1, 2

## CGA0603X5R475K350JT
designator C?  Capacitance: 4.7uF  (hidden comment: *)
Capacitor, Ceramic (MLCC), 4.7uF, ±10%, 35V, X5R, ±10%, SMD 0603; Manufacturer: HRE; Manufacturer Part Number: CGA0603X5R475K350JT; Package Size: 0603; JLCPCB Basic Part: No; JLCPCB Part Number: C6119851; Supplier 1: LCSC; Category: Capacitors - MLCC; Supplier Part Number 1: C6119851; Tolerance: ±10%; Voltage Rating: 35V; Temperature Coefficient: X5R; RoHS: Yes; ComponentLink1Description: Datasheet; ComponentLink2Description: JLCPCB Part URL; ComponentLink2URL: https://jlcpcb.com/partdetail/C6119851; ComponentLink3Description: LCSC Part URL; ComponentLink3URL: https://lcsc.com/product-detail/Multilayer-Ceramic-Capacitors-MLCC---SMD-SMT_HRE-HRE-CGA0603X5R475K350JT_C6119851.html
footprint CAP-0603 (0603 (1608M) Capacitor)
pins: 1, 2

## CGA0603X7R103K500JT
designator C?  Capacitance: 10nF  (hidden comment: *)
Capacitor, Ceramic (MLCC), 10nF, ±10%, 50V, X7R, ±10%, SMD 0603; Manufacturer: HRE; Manufacturer Part Number: CGA0603X7R103K500JT; Package Size: 0603; JLCPCB Basic Part: No; JLCPCB Part Number: C7503504; Supplier 1: LCSC; Category: Capacitors - MLCC; Supplier Part Number 1: C7503504; Tolerance: ±10%; Voltage Rating: 50V; Temperature Coefficient: X7R; RoHS: Yes; ComponentLink1Description: Datasheet; ComponentLink2Description: JLCPCB Part URL; ComponentLink2URL: https://jlcpcb.com/partdetail/C7503504; ComponentLink3Description: LCSC Part URL; ComponentLink3URL: https://lcsc.com/product-detail/Multilayer-Ceramic-Capacitors-MLCC---SMD-SMT_HRE-HRE-CGA0603X7R103K500JT_C7503504.html
footprint CAP-0603 (0603 (1608M) Capacitor)
pins: 1, 2

## CGA0603X7R104K500JT
designator C?  Capacitance: 100nF  (hidden comment: *)
Capacitor, Ceramic (MLCC), 100nF, ±10%, 50V, X7R, ±10%, SMD 0603; Manufacturer: HRE; Manufacturer Part Number: CGA0603X7R104K500JT; Package Size: 0603; JLCPCB Basic Part: No; JLCPCB Part Number: C6119867; Supplier 1: LCSC; Category: Capacitors - MLCC; Supplier Part Number 1: C6119867; Tolerance: ±10%; Voltage Rating: 50V; Temperature Coefficient: X7R; RoHS: Yes; ComponentLink1Description: Datasheet; ComponentLink2Description: JLCPCB Part URL; ComponentLink2URL: https://jlcpcb.com/partdetail/C6119867; ComponentLink3Description: LCSC Part URL; ComponentLink3URL: https://lcsc.com/product-detail/Multilayer-Ceramic-Capacitors-MLCC---SMD-SMT_HRE-HRE-CGA0603X7R104K500JT_C6119867.html
footprint CAP-0603 (0603 (1608M) Capacitor)
pins: 1, 2

## CGA0603X7R222K500JT
designator C?  Capacitance: 2.2nF  (hidden comment: *)
Capacitor, Ceramic (MLCC), 2.2nF, ±10%, 50V, X7R, ±10%, SMD 0603; Manufacturer: HRE; Manufacturer Part Number: CGA0603X7R222K500JT; Package Size: 0603; JLCPCB Basic Part: No; JLCPCB Part Number: C7503502; Supplier 1: LCSC; Category: Capacitors - MLCC; Supplier Part Number 1: C7503502; Tolerance: ±10%; Voltage Rating: 50V; Temperature Coefficient: X7R; RoHS: Yes; ComponentLink1Description: Datasheet; ComponentLink2Description: JLCPCB Part URL; ComponentLink2URL: https://jlcpcb.com/partdetail/C7503502; ComponentLink3Description: LCSC Part URL; ComponentLink3URL: https://lcsc.com/product-detail/Multilayer-Ceramic-Capacitors-MLCC---SMD-SMT_HRE-HRE-CGA0603X7R222K500JT_C7503502.html
footprint CAP-0603 (0603 (1608M) Capacitor)
pins: 1, 2

## CGA0603X7R472K500JT
designator C?  Capacitance: 4.7nF  (hidden comment: *)
Capacitor, Ceramic (MLCC), 4.7nF, ±10%, 50V, X7R, ±10%, SMD 0603; Manufacturer: HRE; Manufacturer Part Number: CGA0603X7R472K500JT; Package Size: 0603; JLCPCB Basic Part: No; JLCPCB Part Number: C7503499; Supplier 1: LCSC; Category: Capacitors - MLCC; Supplier Part Number 1: C7503499; Tolerance: ±10%; Voltage Rating: 50V; Temperature Coefficient: X7R; RoHS: Yes; ComponentLink1Description: Datasheet; ComponentLink2Description: JLCPCB Part URL; ComponentLink2URL: https://jlcpcb.com/partdetail/C7503499; ComponentLink3Description: LCSC Part URL; ComponentLink3URL: https://lcsc.com/product-detail/Multilayer-Ceramic-Capacitors-MLCC---SMD-SMT_HRE-HRE-CGA0603X7R472K500JT_C7503499.html
footprint CAP-0603 (0603 (1608M) Capacitor)
pins: 1, 2

## CL10A104KA8NNNC
designator C?  Capacitance: 100nF  (hidden comment: *)
Capacitor, Ceramic (MLCC), 100nF, 25V, X5R, SMD 0603; Manufacturer: Samsung Electro-Mechanics; Manufacturer Part Number: CL10A104KA8NNNC; Package Size: 0603; JLCPCB Basic Part: No; JLCPCB Part Number: C2762593; Supplier 1: LCSC; Category: Capacitors - MLCC; Supplier Part Number 1: C2762593; Voltage Rating: 25V; Temperature Coefficient: X5R; RoHS: Yes; ComponentLink1Description: Datasheet; ComponentLink1URL: https://wmsc.lcsc.com/wmsc/upload/file/pdf/v2/lcsc/2304140030_Samsung-Electro-Mechanics-CL10A104KA8NNNC_C2762593.pdf; ComponentLink2Description: JLCPCB Part URL; ComponentLink2URL: https://jlcpcb.com/partdetail/C2762593; ComponentLink3Description: LCSC Part URL; ComponentLink3URL: https://lcsc.com/product-detail/Multilayer-Ceramic-Capacitors-MLCC---SMD-SMT_Samsung-Electro-Mechanics-Samsung-Electro-Mechanics-CL10A104KA8NNNC_C2762593.html; ComponentLink4Description: Samsung Component Library; ComponentLink4URL: https://weblib.samsungsem.com/mlcc/mlcc-ec.do?partNumber=CL10A104KA8NNN
footprint CAP-0603 (0603 (1608M) Capacitor)
pins: 1, 2

## CL10A105KA8NFNC
designator C?  Capacitance: 1uF  (hidden comment: *)
Capacitor, Ceramic (MLCC), 1uF, ±10%, 25V, X5R, ±10%, SMD 0603; Manufacturer: Samsung Electro-Mechanics; Manufacturer Part Number: CL10A105KA8NFNC; Package Size: 0603; JLCPCB Basic Part: No; JLCPCB Part Number: C346185; Supplier 1: LCSC; Category: Capacitors - MLCC; Supplier Part Number 1: C346185; Tolerance: ±10%; Voltage Rating: 25V; Temperature Coefficient: X5R; RoHS: Yes; ComponentLink1Description: Datasheet; ComponentLink1URL: https://wmsc.lcsc.com/wmsc/upload/file/pdf/v2/lcsc/2203231830_Samsung-Electro-Mechanics-CL10A105KA8NFNC_C346185.pdf; ComponentLink2Description: JLCPCB Part URL; ComponentLink2URL: https://jlcpcb.com/partdetail/C346185; ComponentLink3Description: LCSC Part URL; ComponentLink3URL: https://lcsc.com/product-detail/Multilayer-Ceramic-Capacitors-MLCC---SMD-SMT_Samsung-Electro-Mechanics-Samsung-Electro-Mechanics-CL10A105KA8NFNC_C346185.html; ComponentLink4Description: Samsung Component Library; ComponentLink4URL: https://weblib.samsungsem.com/mlcc/mlcc-ec.do?partNumber=CL10A105KA8NFN
footprint CAP-0603 (0603 (1608M) Capacitor)
pins: 1, 2

## CL10A105KA8NNNC
designator C?  Capacitance: 1uF  (hidden comment: *)
Capacitor, Ceramic (MLCC), 1uF, ±10%, 25V, X5R, ±10%, SMD 0603; Manufacturer: Samsung Electro-Mechanics; Manufacturer Part Number: CL10A105KA8NNNC; Package Size: 0603; JLCPCB Basic Part: No; JLCPCB Part Number: C5673; Supplier 1: LCSC; Category: Capacitors - MLCC; Supplier Part Number 1: C5673; Tolerance: ±10%; Voltage Rating: 25V; Temperature Coefficient: X5R; RoHS: Yes; ComponentLink1Description: Datasheet; ComponentLink1URL: https://wmsc.lcsc.com/wmsc/upload/file/pdf/v2/lcsc/2304140030_Samsung-Electro-Mechanics-CL10A105KA8NNNC_C5673.pdf; ComponentLink2Description: JLCPCB Part URL; ComponentLink2URL: https://jlcpcb.com/partdetail/C5673; ComponentLink3Description: LCSC Part URL; ComponentLink3URL: https://lcsc.com/product-detail/Multilayer-Ceramic-Capacitors-MLCC---SMD-SMT_Samsung-Electro-Mechanics-Samsung-Electro-Mechanics-CL10A105KA8NNNC_C5673.html; ComponentLink4Description: Samsung Component Library; ComponentLink4URL: https://weblib.samsungsem.com/mlcc/mlcc-ec.do?partNumber=CL10A105KA8NNN
footprint CAP-0603 (0603 (1608M) Capacitor)
pins: 1, 2
